# Altium footprint library boxer_pas.PcbLib: 67 footprints (part 5 of 5)
Each footprint in its own frame and in the unit in brackets; x right, y up, seen from the top. Pads: shape width x height; smd on the part's side, far side on the other; paste and mask are expansions set on the pad; w line width, h text height; cw(c..) or ccw(c..) is an arc to the next point about the centre after c.
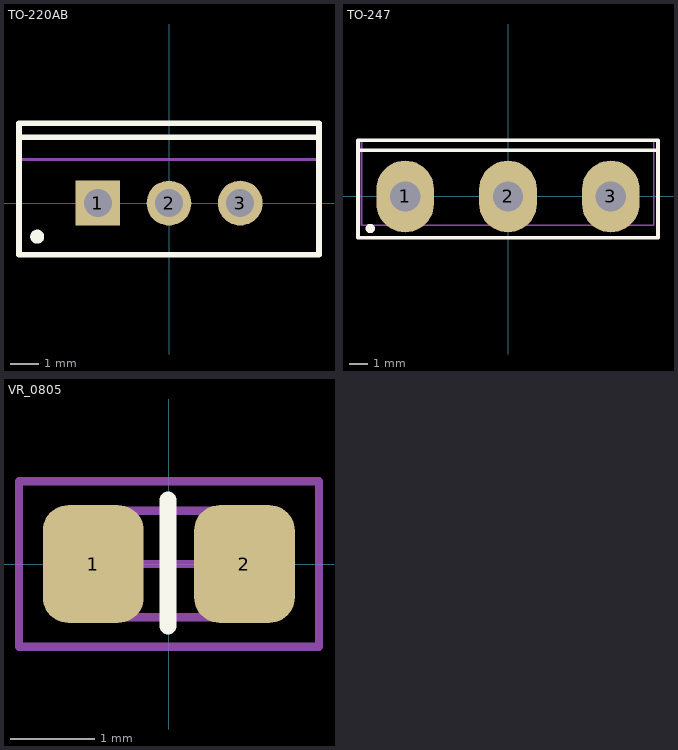
[diagram p4: the footprints below, top view; thin cyan lines are the x and y axes]

## TO-220AB [mm] "TO, Thru-Hole, Vertical, Heatsink Mounted; 3 In-Line Leads; Pitch 2.54 mm"
height 19.3
pads (3):
  rect 1.6x1.6 hole 1: 1(-2.54,0)
  round 1.6 hole 1: 2(0,0) 3(2.54,0)
Top Overlay:
  circle w0.25: c-4.7,-1.2 r0.125
  lines w0.2: -5.35,2.35 5.35,2.35 ; -5.35,-1.85 -5.35,2.85 5.35,2.85 5.35,-1.85 -5.35,-1.85
Mechanical 13:
  lines w0.1: -5.35,1.55 5.35,1.55 ; -5.35,-1.85 5.35,-1.85 5.35,2.85 -5.35,2.85 -5.35,-1.85
Mechanical 15:
  lines w0.1: -0.5,0 0.5,0 ; 0,-0.5 0,0.5
3D body: height 12.9, standoff 4, extent -5.4,-1.9 5.4,2.9
3D body: height 19.3, standoff 12.9, extent -5.349,1.551 5.349,2.849

## TO-247 [mm] "SIP with Mounting Hole; 3 Leads; Body 20 x 15.6 x 5 mm (typ); Pitch 5.45 mm"
height 24.6
pads (3):
  oval 3.048x3.81 hole 1.6: 1(-5.45,0) 2(0,0) 3(5.45,0)
Top Overlay:
  circle w0.25: c-7.3,-1.696 r0.125
  lines w0.2: -7.95,2.454 7.95,2.454 ; -7.95,-2.184 -7.95,2.976 7.95,2.976 7.95,-2.184 -7.95,-2.184
Mechanical 13:
  lines w0.1: -7.772,-1.524 -7.772,2.976 7.725,2.976 7.725,-1.524 -7.772,-1.524
Mechanical 15:
  lines w0.1: -0.5,0 0.5,0 ; 0,-0.5 0,0.5
3D body "User Library-TOP3.step": height 27.9, standoff -8, extent -7.775,-1.524 7.725,2.976

## VR_0805 [mm] "Chip Varistor Body 2.0x1.2mm, IPC Medium Density"
height 0.7
pads (2):
  rrect50% 1.2x1.4 smd: 1(-0.9,0) 2(0.9,0)
Top Overlay:
  lines w0.2: -0.011,-0.737 -0.011,0.762
Mechanical 13:
  lines w0.1: -1.027,-0.635 -1.027,0.635 1.005,0.635 1.005,-0.635 -1.027,-0.635
  text ".Value" at -0.914,-0.254 h0.5
  text ".Designator" at -1.666,0.943 h0.5
Mechanical 15:
  lines w0.1: -0.5,0 0.5,0 ; 0,-0.5 0,0.5 ; -1.784,-0.986 -1.784,0.986 1.788,0.986 1.788,-0.986 -1.784,-0.986
3D body "User Library-ind_0805.step": height 0.95, standoff 0, extent -1.011,-0.625 0.989,0.575